# Altium footprint library lib_protel_HC.PCBLIB: 724 footprints (part 37 of 46)
Each footprint in its own frame and in the unit in brackets; x right, y up, seen from the top. Pads: shape width x height; smd on the part's side, far side on the other; paste and mask are expansions set on the pad; w line width, h text height; cw(c..) or ccw(c..) is an arc to the next point about the centre after c.
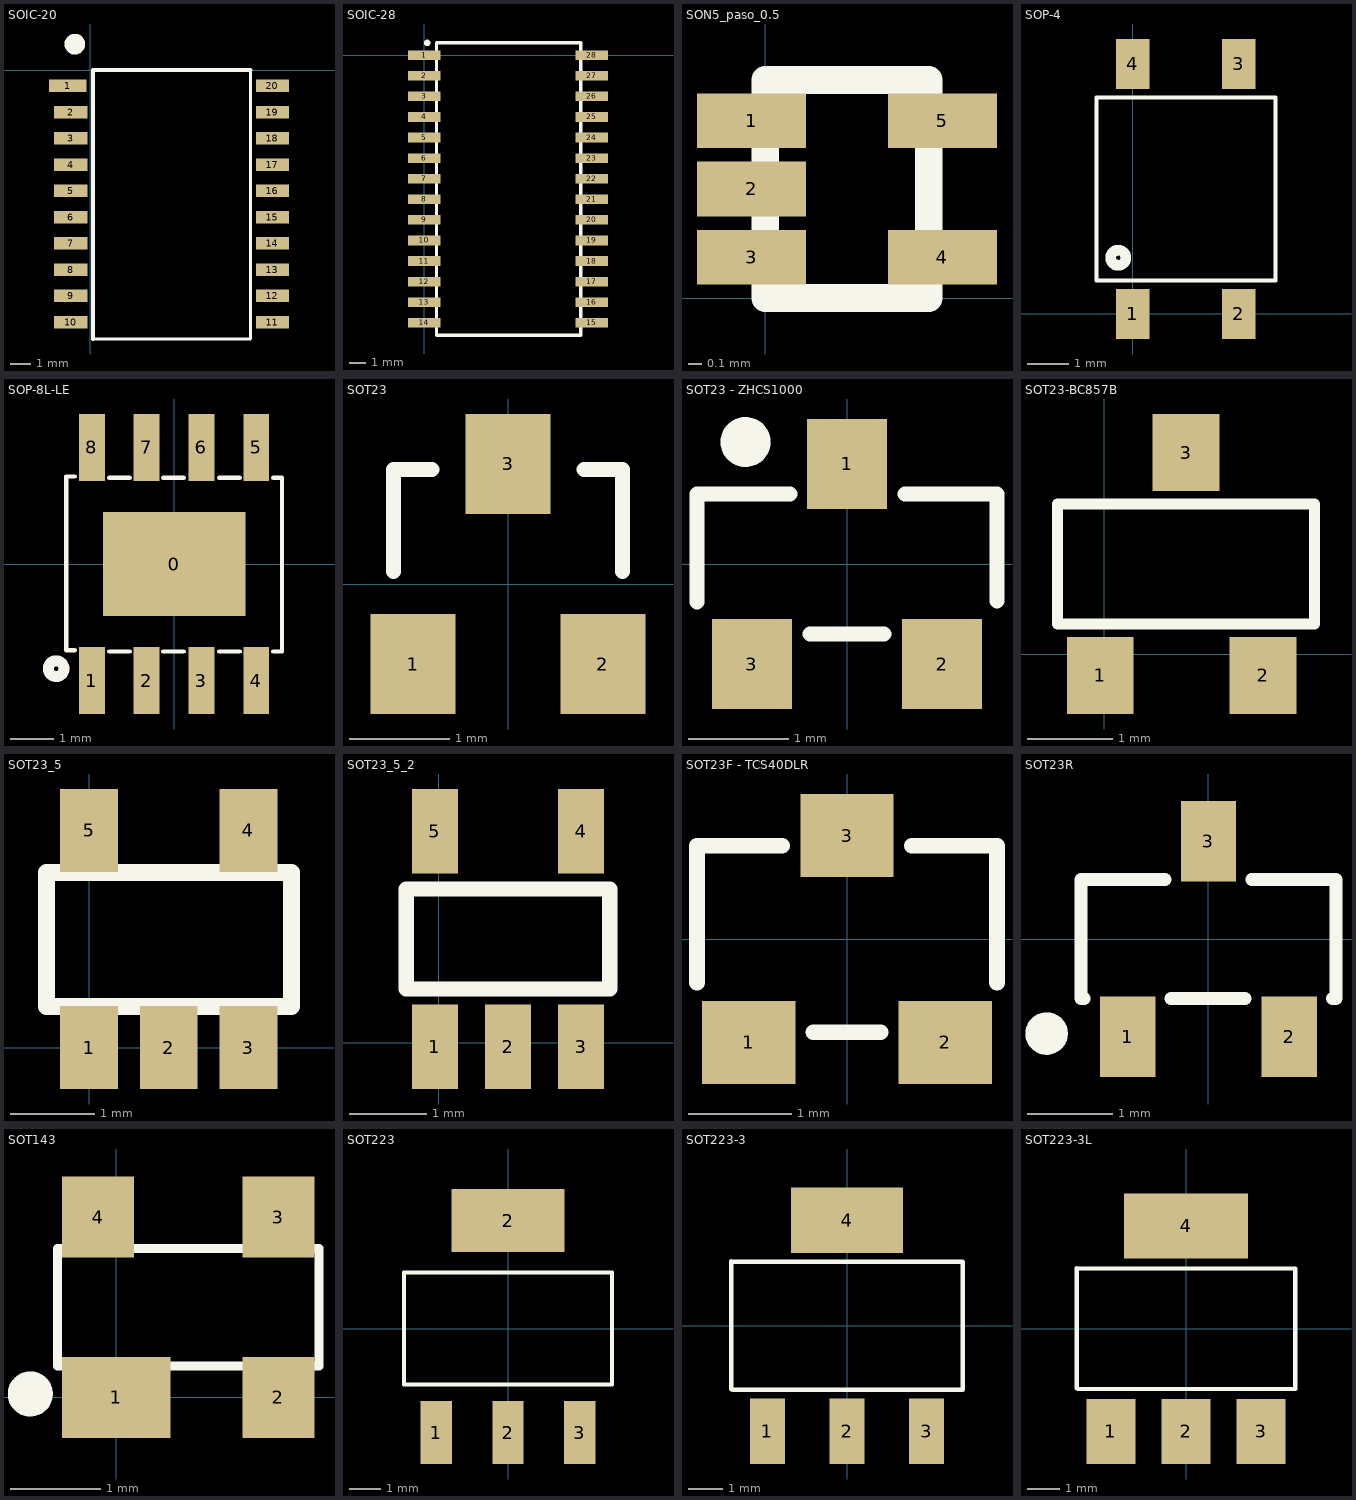
[diagram p36: the footprints below, top view; thin cyan lines are the x and y axes]

## SOIC-20 [mm]
height 2
pads (20):
  rect 1.8x0.6 smd: 1(-1.1,-0.762)
  rect 1.6x0.6 smd: 2(-0.95,-2.032) 3(-0.95,-3.302) 4(-0.95,-4.572) 5(-0.95,-5.842) 6(-0.95,-7.112) 7(-0.95,-8.382) 8(-0.95,-9.652) 9(-0.95,-10.922) 10(-0.95,-12.192) 11(8.8,-12.192) 12(8.8,-10.922) 13(8.8,-9.652) 14(8.8,-8.382) 15(8.8,-7.112) 16(8.8,-5.842) 17(8.8,-4.572) 18(8.8,-3.302) 19(8.8,-2.032) 20(8.8,-0.762)
Top Overlay:
  circle w0.5: c-0.75,1.25 r0.25
  lines w0.152: 0.127,-13.005 7.747,-13.005 7.747,0
  lines w0.2: 0.127,-13 0.127,0 7.727,0

## SOIC-28 [mm]
pads (28):
  rect 2x0.6 smd: 1(0,0) 2(0,-1.27) 3(0,-2.54) 4(0,-3.81) 5(0,-5.08) 6(0,-6.35) 7(0,-7.62) 8(0,-8.89) 9(0,-10.16) 10(0,-11.43) 11(0,-12.7) 12(0,-13.97) 13(0,-15.24) 14(0,-16.51) 15(10.34,-16.51) 16(10.34,-15.24) 17(10.34,-13.97) 18(10.34,-12.7) 19(10.34,-11.43) 20(10.34,-10.16) 21(10.34,-8.89) 22(10.34,-7.62) 23(10.34,-6.35) 24(10.34,-5.08) 25(10.34,-3.81) 26(10.34,-2.54) 27(10.34,-1.27) 28(10.34,0)
Top Overlay:
  circle w0.254: c0.183,0.762 r0.071
  lines w0.2: 0.762,-17.272 0.762,0.762 9.652,0.762 9.652,-17.272 0.762,-17.272

## SON5_paso_0.5 [mm]
height 0.55
pads (5):
  rect 0.8x0.4 smd: 1(-0.1,1.3) 2(-0.1,0.8) 3(-0.1,0.3) 4(1.3,0.3) 5(1.3,1.3)
Top Overlay:
  lines w0.203: 0,0 0,1.6 1.2,1.6 1.2,0 0,0

## SOP-4 [mm] "SOP-4"
height 2.1
pads (4):
  rect 0.8x1.2 smd: 1(0,0) 2(2.54,0) 3(2.54,6) 4(0,6)
Top Overlay:
  circle w0.254: c-0.35,1.35 r0.182
  lines w0.1: -0.875,0.8 3.425,0.8 3.425,5.2 -0.875,5.2 -0.875,0.8

## SOP-8L-LE [mm] "SOP-8L-Le"
height 1.75
pads (9):
  rect 3.3x2.4 smd: 0(0,0)
  rect 0.6x1.55 smd: 1(-1.905,-2.7) 2(-0.635,-2.7) 3(0.635,-2.7) 4(1.905,-2.7) 5(1.905,2.7) 6(0.635,2.7) 7(-0.635,2.7) 8(-1.905,2.7)
Top Overlay:
  circle w0.254: c-2.732,-2.425 r0.182
  lines w0.1: -2.3,-2 -2.5,-2 -2.5,2.025 -2.3,2.025 ; -1.5,-2.025 -1.025,-2.025 ; -1.5,2 -1.025,2 ; -0.25,-2.025 0.225,-2.025 ; -0.25,2 0.225,2 ; 1.05,-2.025 1.525,-2.025 ; 1.05,2 1.525,2 ; 2.3,-2.025 2.5,-2.025 ; 2.3,2 2.5,2 2.5,-2

## SOT23 [mm] "SOT-23; 3 Leads; Body 3.0 x 2.5 mm, inc. leads (LxW max)"
height 1.1
pads (3):
  rect 0.85x1 smd: 1(-0.95,-0.8) 2(0.95,-0.8) 3(0,1.2)
Top Overlay:
  lines w0.15: -1.143,0.127 -1.143,1.143 -0.762,1.143 ; 0.762,1.143 1.143,1.143 1.143,0.127
3D body "User Library-SOT95P280X135-3M[SOT23_TO-236AA].STEP": height 1.3, standoff 0, extent -1.5,-1.3 1.5,1.7

## SOT23 - ZHCS1000 [mm] "SOT-23 ZHCS1000"
height 1.1
pads (3):
  rect 0.8x0.9 smd: 1(0,1) 2(0.95,-1) 3(-0.95,-1)
Top Overlay:
  circle w0.25: c-1.015,1.22 r0.125
  lines w0.15: -1.5,-0.38 -1.5,0.7 -0.57,0.7 ; -0.37,-0.7 0.37,-0.7 ; 0.58,0.7 1.5,0.7 1.5,-0.37

## SOT23-BC857B [mm]
pads (3):
  rect 0.78x0.9 smd: 1(-0.047,-0.25) 2(1.853,-0.25) 3(0.953,2.35)
Top Overlay:
  lines w0.127: -0.547,0.35 -0.547,1.75 2.453,1.75 2.453,0.35 -0.547,0.35

## SOT23_5 [mm]
height 1.02
pads (5):
  rect 0.69x0.99 smd: 1(0,0) 2(0.95,0) 3(1.9,0) 4(1.9,2.59) 5(0,2.59)
Top Overlay:
  lines w0.203: -0.507,0.488 2.413,0.488 2.413,2.088 -0.507,2.088 -0.507,0.488
3D body "SW3dPS-SOT-23-5L.STEP": height 1.09, standoff -0.02, extent -0.5,-0.1 2.4,2.7

## SOT23_5_2 [mm]
height 1.02
pads (5):
  rect 0.6x1.1 smd: 1(-0.05,-0.05) 2(0.9,-0.05) 3(1.85,-0.05) 4(1.85,2.75) 5(-0.05,2.75)
Top Overlay:
  lines w0.2: -0.425,0.7 2.225,0.7 2.225,2 -0.425,2 -0.425,0.7
3D body "SW3dPS-SOT-23-5L.STEP": height 1.09, standoff -0.02, extent -0.55,-0.025 2.35,2.775

## SOT23F - TCS40DLR [mm] "SON3-P-0203-1.90S"
height 0.8
pads (3):
  rect 0.9x0.8 smd: 1(-0.95,-1) 2(0.95,-1) 3(0,1)
Top Overlay:
  lines w0.15: -1.45,-0.425 -1.45,0.875 ; -1.45,0.9 -0.625,0.9 ; -0.325,-0.9 0.325,-0.9 ; 0.625,0.9 1.45,0.9 1.45,-0.425
3D body "2SD0601A.stp": height 1.1, standoff -0.08, extent -1.412,-1.38 1.488,1.38

## SOT23R [mm] "SOT-23R; 3 Leads; Body 3.0 x 2.5 mm, inc. leads (LxW max)"
height 1.35
pads (3):
  rect 0.65x0.95 smd: 1(-0.95,-1.15) 2(0.95,-1.15) 3(0,1.15)
Top Overlay:
  circle w0.25: c-1.903,-1.112 r0.125
  lines w0.15: -1.46,-0.7 -1.5,-0.7 -1.5,0.7 -0.51,0.7 ; -0.44,-0.7 0.43,-0.7 ; 0.51,0.7 1.5,0.7 1.5,-0.7 1.46,-0.7
3D body "User Library-SOT-23-3.STEP": height 1, standoff -0.01, extent -1.5,-1.25 1.5,1.25

## SOT143 [mm] "SOT143"
height 1
pads (4):
  rect 1.2x0.9 smd: 1(0,0)
  rect 0.8x0.9 smd: 2(1.8,0) 3(1.8,2) 4(-0.2,2)
Top Overlay:
  circle w0.25: c-0.953,0.038 r0.125
  lines w0.1: -0.65,0.35 -0.65,1.65 2.25,1.65 2.25,0.35 -0.65,0.35

## SOT223 [mm]
height 1.6
pads (4):
  rect 1x2 smd: 1(-2.286,-3.302) 2(0,-3.302) 3(2.286,-3.302)
  rect 3.6x2 smd: 2(0,3.429)
Top Overlay:
  lines w0.127: -3.302,-1.778 -3.302,1.778 3.302,1.778 3.302,-1.778 -3.302,-1.778

## SOT223-3 [mm]
height 1.8
pads (4):
  rect 1x1.9 smd: 1(-2.3,-3.05) 2(0,-3.05) 3(2.3,-3.05)
  rect 3.25x1.9 smd: 4(0,3.05)
Top Overlay:
  lines w0.127: -3.35,-1.84 -3.35,1.86 ; -3.316,-1.85 3.35,-1.85 3.35,1.85 -3.316,1.85
3D body "SW3dPS-SOT-223-1.STEP": height 1.65, standoff 0, extent -3.25,-3.5 3.25,3.5

## SOT223-3L [mm]
height 1.8
pads (4):
  rect 1.5x2 smd: 1(-2.3,-3.15) 2(0,-3.15) 3(2.3,-3.15)
  rect 3.8x2 smd: 4(0,3.15)
Top Overlay:
  lines w0.127: -3.35,-1.84 -3.35,1.86 ; -3.316,-1.85 3.35,-1.85 3.35,1.85 -3.316,1.85
3D body "SW3dPS-SOT-223-1.STEP": height 1.65, standoff 0, extent -3.25,-3.5 3.25,3.5